# Altium integrated library STM32MINI.IntLib: 27 symbols
Pins are listed as number, name and electrical type; pins without a type are passive.

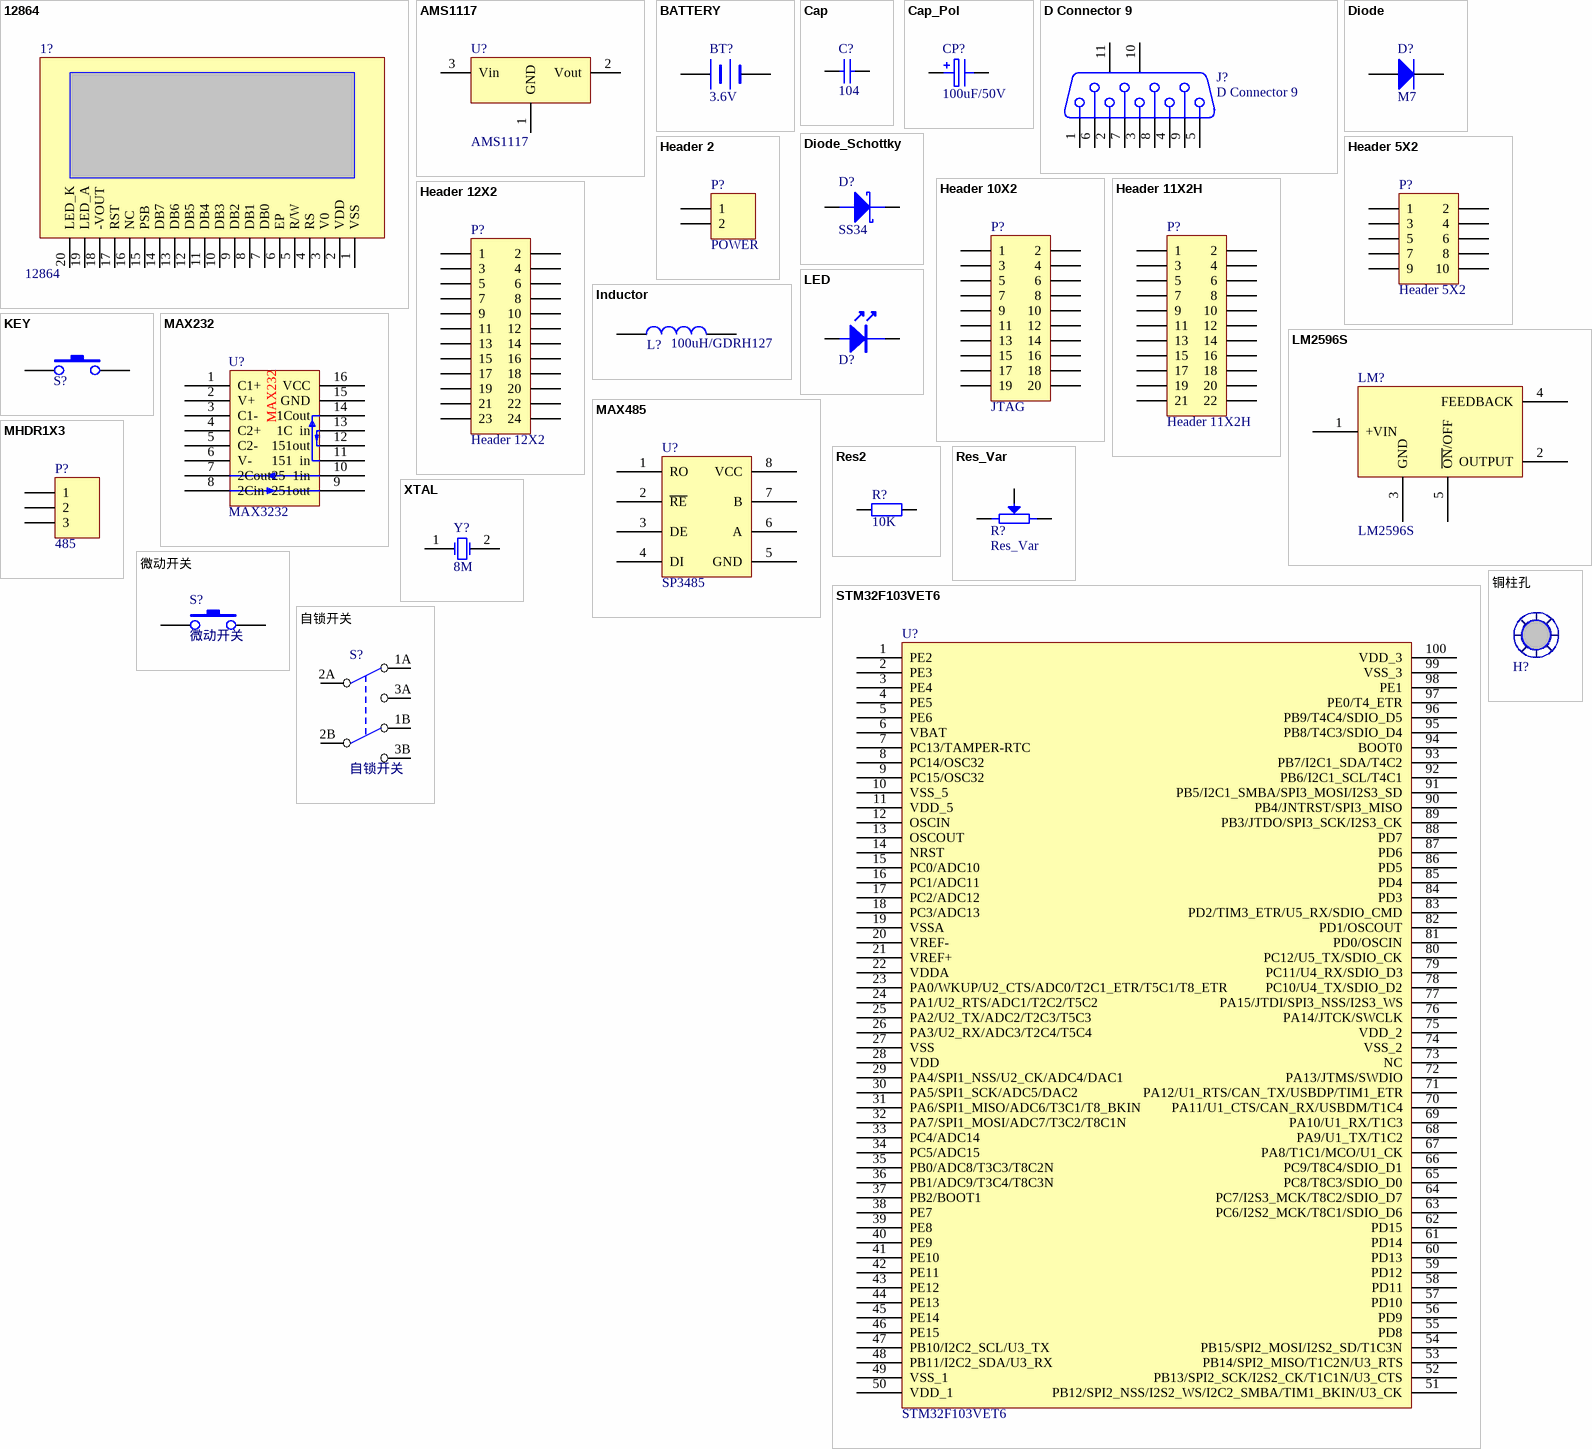
[diagram p0: symbols 12864 to 铜柱孔]

## 12864
designator 1?
footprint YX12864B
pins: 1 VSS, 2 VDD, 3 V0, 4 RS, 5 R/W, 6 EP, 7 DB0, 8 DB1, 9 DB2, 10 DB3, 11 DB4, 12 DB5, 13 DB6, 14 DB7, 15 PSB, 16 NC, 17 RST, 18 -VOUT, 19 LED_A, 20 LED_K

## AMS1117
designator U?
三端稳压器件
footprint SOT223
pins: 1 GND, 2 Vout, 3 Vin

## BATTERY
designator BT?, comment 3.6V
3.6V纽扣电池
footprint BAT3V
footprint CR1220
pins: 1 +, 2 -
2 alternate drawings of the same symbol

## Cap
designator C?, comment 104
Capacitor; Published: 8-Jun-2000; LatestRevisionDate: 17-Jul-2002; LatestRevisionNote: Re-released for DXP Platform.; PackageReference: RAD-0.3; Publisher: Altium Limited; Value: 104
footprint RAD-0.3 (Radial Cap, Thru-Hole; 2 Leads; 0.3 in Pin Spacing)
footprint CAPR2.54-5.1x3.2 (Capacitor, Ceramic, Thru-Hole, Dipped Radial; Body 5.1 x 3.2 mm (WxT) Pin Spacing 2.54 mm (typ))
footprint CAPR5.08-7.8x3.2 (Capacitor, Ceramic, Thru-Hole, Dipped Radial; Body 7.8 x 3.2 mm (WxT) Pin Spacing 5.08 mm (typ))
simulation model CAP (Capacitor)
signal-integrity model Cap
footprint 0805R
footprint 0805C
pins: 1, 2

## Cap_Pol
designator CP?, comment 100uF/50V
极性电容
footprint CAP_8X105
footprint SMD-CT-3216 (贴片胆电容封装，长3.2mm,宽1.6mm)
footprint SMD-EC-F8 (贴片电解电容封装)
pins: 1, 2

## D Connector 9
designator J?
Receptacle Assembly, 9 Position, Right Angle; PackageDocument: O; Positions: 9; Published: 15-Jun-2001; LatestRevisionDate: 17-Jul-2002; LatestRevisionNote: Re-released for DXP Platform.; DatasheetDocument: 1-Sep-1999; PackageReference: 788750; Publisher: Altium Limited; Orientation: Right Angle; Gender: Receptacle
footprint DSUB1.385-2H9 (Connector; D Subminiature; 9 Position; Right Angle; Pitch 1.385 mm)
signal-integrity model Connector
pins: 1, 2, 3, 4, 5, 6, 7, 8, 9, 10 MH1, 11 MH2

## Diode
designator D?, comment M7
Default Diode; Published: 8-Jun-2000; LatestRevisionDate: 17-Jul-2002; LatestRevisionNote: Re-released for DXP Platform.; PackageVersion: Sep-1996; PackageReference: SMC; Publisher: Altium Limited; PackageDescription: DO-214-AB/SMC; 2 C-Bend Leads; Body 7.9 x 5.9 mm, inc. leads (LxW); Code_JEDEC: DO-214-AB
footprint SMA
simulation model DIODE (Diode)
signal-integrity model Diode
pins: 1 A, 2 K

## Diode_Schottky
designator D?, comment SS34
肖特基
footprint SMC
pins: 1 A, 2 K

## Header 2
designator P?, comment POWER
Header, 2-Pin; LatestRevisionDate: 17-Jul-2002; LatestRevisionNote: Re-released for DXP Platform.; Publisher: Altium Limited
footprint 3.81-2
signal-integrity model Connector
pins: 1, 2

## Header 5X2
designator P?
Header, 5-Pin, Dual row; LatestRevisionDate: 17-Jul-2002; LatestRevisionNote: Re-released for DXP Platform.; Publisher: Altium Limited
footprint HDR2X5 (Connector; Header; 5x2 Position)
signal-integrity model Connector
pins: 1, 2, 3, 4, 5, 6, 7, 8, 9, 10

## Header 10X2
designator P?, comment JTAG
Header, 10-Pin, Dual row; LatestRevisionDate: 17-Jul-2002; LatestRevisionNote: Re-released for DXP Platform.; Publisher: Altium Limited
footprint JTAG20
signal-integrity model Connector
pins: 1, 2, 3, 4, 5, 6, 7, 8, 9, 10, 11, 12, 13, 14, 15, 16, 17, 18, 19, 20

## Header 11X2H
designator P?
Header, 11-Pin, Dual row, Right Angle; LatestRevisionDate: 17-Jul-2002; LatestRevisionNote: Re-released for DXP Platform.; Publisher: Altium Limited
footprint HDR2X11 (Connector; Header; 11x2 Position)
signal-integrity model Connector
pins: 1, 2, 3, 4, 5, 6, 7, 8, 9, 10, 11, 12, 13, 14, 15, 16, 17, 18, 19, 20, 21, 22

## Header 12X2
designator P?
Header, 12-Pin, Dual row; LatestRevisionDate: 17-Jul-2002; LatestRevisionNote: Re-released for DXP Platform.; Publisher: Altium Limited
footprint HDR2X12 (Connector; Header; 12x2 Position)
signal-integrity model Connector
pins: 1, 2, 3, 4, 5, 6, 7, 8, 9, 10, 11, 12, 13, 14, 15, 16, 17, 18, 19, 20, 21, 22, 23, 24

## Inductor
designator L?, comment 100uH/GDRH127
电感
footprint SMDRH63/65 (SMDRH63：6.2X6.6X3；SMDRH65：6.2X6.6X5)
footprint SMDRH73/74 (SMDRH73：7.3X7.3X3.5；SMDRH74：7.3X7.3X4.5)
footprint SMDRH124/125/127 (SMDRH124/125/127：12X12X4.5/6.0/8.0；)
footprint SMDRH124/125/127 (SMDRH124/125/127：12X12X4.5/6.0/8.0；)
pins: 1, 2

## KEY
designator S?  (value not drawn)
footprint SW_PB - 6.5x4.5
3D model 4pin_TS-1143-WP (PCB3D Model)
pins: 1, 2

## LED
designator D?  (value not drawn)
footprint LED_0805
pins: 1, 2

## LM2596S
designator LM?
footprint TO-263S
pins: 1 +VIN, 2 OUTPUT, 3 GND, 4 FEEDBACK, 5 ~{ON}/OFF

## MAX232
designator U?, comment MAX3232
footprint SO-16
pins: 1 C1+, 2 V+, 3 C1-, 4 C2+, 5 C2-, 6 V-, 7 2Cout, 8 2Cin, 9 251out, 10 25  1in, 11 151  in, 12 151out, 13 1C  in, 14 1Cout, 15 GND, 16 VCC

## MAX485
designator U?, comment SP3485
footprint SO-8
pins: 1 RO (oe), 2 ~{RE} (oe), 3 DE (oe), 4 DI (oe), 5 GND, 6 A (oe), 7 B (oe), 8 VCC

## MHDR1X3
designator P?, comment 485
Header, 3-Pin; LatestRevisionDate: 17-Jul-2002; LatestRevisionNote: Re-released for DXP Platform.; Publisher: Altium Limited
signal-integrity model Connector
footprint SIP3
pins: 1, 2, 3

## Res2
designator R?, comment 10K
Resistor; Published: 8-Jun-2000; LatestRevisionDate: 17-Jul-2002; LatestRevisionNote: Re-released for DXP Platform.; PackageReference: AXIAL-0.4; Publisher: Altium Limited; Value: 10K
footprint AXIAL-0.4 (Axial Device, Thru-Hole; 2 Leads; 0.4 in Pin Spacing)
simulation model RESISTOR (Resistor)
signal-integrity model Res
footprint 0805R
pins: 1, 2

## Res_Var
designator R?
可变电阻
footprint VR1
pins: 1, 2 W, 3 2

## STM32F103VET6
designator U?
footprint LQFP100
pins: 1 PE2, 2 PE3, 3 PE4, 4 PE5, 5 PE6, 6 VBAT, 7 PC13/TAMPER-RTC, 8 PC14/OSC32, 9 PC15/OSC32, 10 VSS_5, 11 VDD_5, 12 OSCIN, 13 OSCOUT, 14 NRST, 15 PC0/ADC10, 16 PC1/ADC11, 17 PC2/ADC12, 18 PC3/ADC13, 19 VSSA, 20 VREF-, 21 VREF+, 22 VDDA, 23 PA0/WKUP/U2_CTS/ADC0/T2C1_ETR/T5C1/T8_ETR, 24 PA1/U2_RTS/ADC1/T2C2/T5C2, 25 PA2/U2_TX/ADC2/T2C3/T5C3, 26 PA3/U2_RX/ADC3/T2C4/T5C4, 27 VSS, 28 VDD, 29 PA4/SPI1_NSS/U2_CK/ADC4/DAC1, 30 PA5/SPI1_SCK/ADC5/DAC2, 31 PA6/SPI1_MISO/ADC6/T3C1/T8_BKIN, 32 PA7/SPI1_MOSI/ADC7/T3C2/T8C1N, 33 PC4/ADC14, 34 PC5/ADC15, 35 PB0/ADC8/T3C3/T8C2N, 36 PB1/ADC9/T3C4/T8C3N, 37 PB2/BOOT1, 38 PE7, 39 PE8, 40 PE9, 41 PE10, 42 PE11, 43 PE12, 44 PE13, 45 PE14, 46 PE15, 47 PB10/I2C2_SCL/U3_TX, 48 PB11/I2C2_SDA/U3_RX, 49 VSS_1, 50 VDD_1, 51 PB12/SPI2_NSS/I2S2_WS/I2C2_SMBA/TIM1_BKIN/U3_CK, 52 PB13/SPI2_SCK/I2S2_CK/T1C1N/U3_CTS, 53 PB14/SPI2_MISO/T1C2N/U3_RTS, 54 PB15/SPI2_MOSI/I2S2_SD/T1C3N, 55 PD8, 56 PD9, 57 PD10, 58 PD11, 59 PD12, 60 PD13, 61 PD14, 62 PD15, 63 PC6/I2S2_MCK/T8C1/SDIO_D6, 64 PC7/I2S3_MCK/T8C2/SDIO_D7, 65 PC8/T8C3/SDIO_D0, 66 PC9/T8C4/SDIO_D1, 67 PA8/T1C1/MCO/U1_CK, 68 PA9/U1_TX/T1C2, 69 PA10/U1_RX/T1C3, 70 PA11/U1_CTS/CAN_RX/USBDM/T1C4, 71 PA12/U1_RTS/CAN_TX/USBDP/TIM1_ETR, 72 PA13/JTMS/SWDIO, 73 NC, 74 VSS_2, 75 VDD_2, 76 PA14/JTCK/SWCLK, 77 PA15/JTDI/SPI3_NSS/I2S3_WS, 78 PC10/U4_TX/SDIO_D2, 79 PC11/U4_RX/SDIO_D3, 80 PC12/U5_TX/SDIO_CK, 81 PD0/OSCIN, 82 PD1/OSCOUT, 83 PD2/TIM3_ETR/U5_RX/SDIO_CMD, 84 PD3, 85 PD4, 86 PD5, 87 PD6, 88 PD7, 89 PB3/JTDO/SPI3_SCK/I2S3_CK, 90 PB4/JNTRST/SPI3_MISO, 91 PB5/I2C1_SMBA/SPI3_MOSI/I2S3_SD, 92 PB6/I2C1_SCL/T4C1, 93 PB7/I2C1_SDA/T4C2, 94 BOOT0, 95 PB8/T4C3/SDIO_D4, 96 PB9/T4C4/SDIO_D5, 97 PE0/T4_ETR, 98 PE1, 99 VSS_3, 100 VDD_3

## XTAL
designator Y?, comment 8M
Crystal Oscillator; Published: 8-Jun-2000; LatestRevisionDate: 17-Jul-2002; LatestRevisionNote: Re-released for DXP Platform.; PackageReference: R38; Publisher: Altium Limited; PackageDescription: Crystal, Thru-Hole; 2 Leads; Body 3.1 x 8.2 mm (Dia.xH)
footprint XTAL2
simulation model XTAL (Spice Subcircuit)
pins: 1 OSC1, 2 OSC2

## 微动开关
designator S?
footprint SW_PB - 6.5x4.5
pins: 1, 2

## 自锁开关
designator S?
footprint 自锁开关
pins: 1A NC1, 1B NC2, 2A COMMON1, 2B COMMON2, 3A NO1, 3B NO2

## 铜柱孔
designator H?  (value not drawn)
footprint HOLE (铜柱孔)
pins: 0, 0